# Altium footprint library Sockets.PcbLib: 80 footprints (part 4 of 6)
Each footprint in its own frame and in the unit in brackets; x right, y up, seen from the top. Pads: shape width x height; smd on the part's side, far side on the other; paste and mask are expansions set on the pad; w line width, h text height; cw(c..) or ccw(c..) is an arc to the next point about the centre after c.
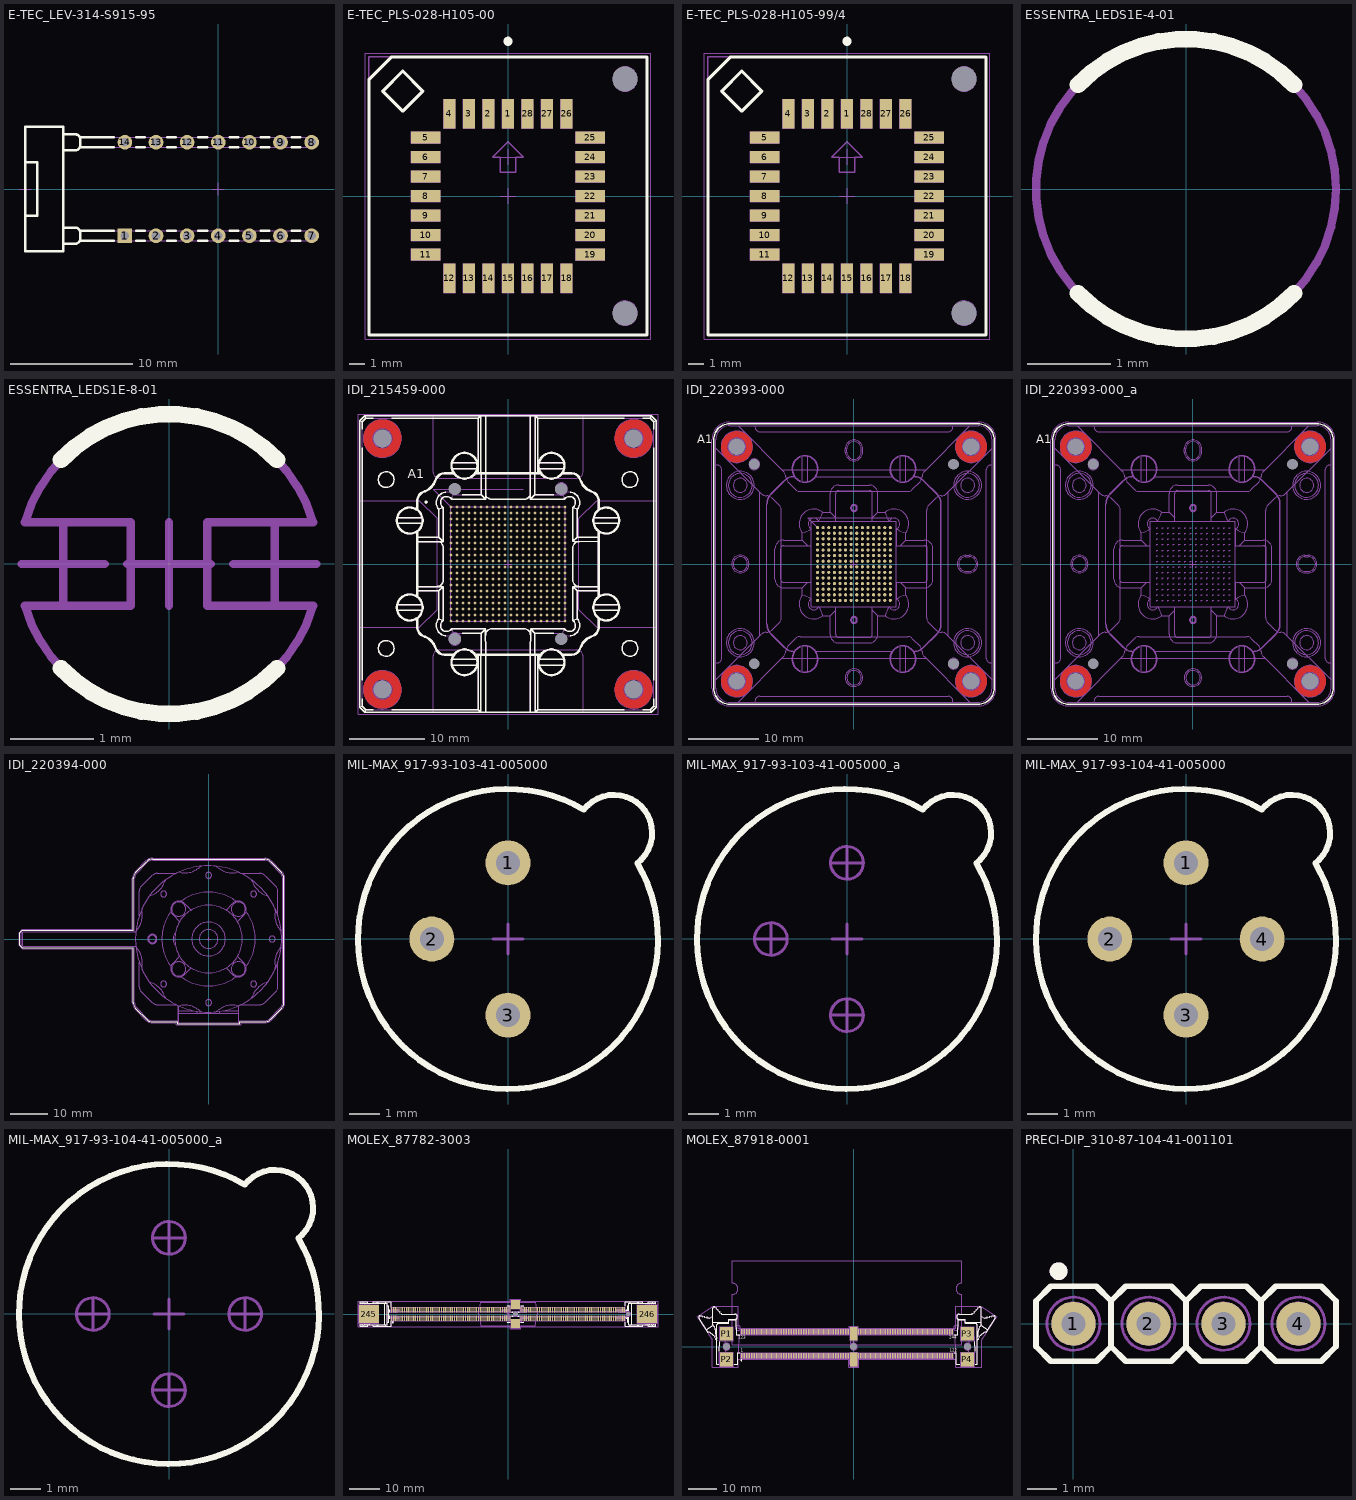
[diagram p3: the footprints below, top view; thin cyan lines are the x and y axes]

## E-TEC_LEV-314-S915-95 [mm] "Vertical DIP Socket 14 Leads, Row Spacing 7.62mm; Pitch 2.54 mm"
height 20.32
pads (14):
  rect 1.2x1.2 hole 0.7: 1(-7.62,-3.81)
  round 1.2 hole 0.7: 2(-5.08,-3.81) 3(-2.54,-3.81) 4(0,-3.81) 5(2.54,-3.81) 6(5.08,-3.81) 7(7.62,-3.81) 8(7.62,3.81) 9(5.08,3.81) 10(2.54,3.81) 11(0,3.81) 12(-2.54,3.81) 13(-5.08,3.81) 14(-7.62,3.81)
Top Overlay:
  lines w0.2: -15.76,-2.2 -14.76,-2.2 -14.76,2.2 -15.76,2.2 ; -12.66,-4.46 -11.66,-4.46 ccw(c-11.66,-4.06) -11.26,-4.06 -11.26,-3.56 ccw(c-11.66,-3.56) -11.66,-3.16 -12.66,-3.16 ; -12.66,3.16 -11.66,3.16 ccw(c-11.66,3.56) -11.26,3.56 -11.26,4.06 ccw(c-11.66,4.06) -11.66,4.46 -12.66,4.46 ; -11.289,-4.21 -8.536,-4.21 ; -11.289,-3.41 -8.536,-3.41 ; -11.289,3.41 -8.536,3.41 ; -11.289,4.21 -8.536,4.21 ; -6.703,-4.21 -5.996,-4.21 ; -6.703,-3.41 -5.996,-3.41 ; -6.703,3.41 -5.996,3.41 ; -6.703,4.21 -5.996,4.21 ; -4.163,-4.21 -3.456,-4.21 ; -4.163,-3.41 -3.456,-3.41 ; -4.163,3.41 -3.456,3.41 ; -4.163,4.21 -3.456,4.21 ; -1.623,-4.21 -0.916,-4.21 ; -1.623,-3.41 -0.916,-3.41 ; -1.623,3.41 -0.916,3.41 ; -1.623,4.21 -0.916,4.21 ; 0.917,-4.21 1.624,-4.21 ; 0.917,-3.41 1.624,-3.41 ; 0.917,3.41 1.624,3.41 ; 0.917,4.21 1.624,4.21 ; 3.457,-4.21 4.164,-4.21 ; 3.457,-3.41 4.164,-3.41 ; 3.457,3.41 4.164,3.41 ; 3.457,4.21 4.164,4.21 ; 5.997,-4.21 6.704,-4.21 ; 5.997,-3.41 6.704,-3.41 ; 5.997,3.41 6.704,3.41 ; 5.997,4.21 6.704,4.21 ; -15.76,-5.08 -12.66,-5.08 -12.66,5.08 -15.76,5.08 -15.76,-5.08
Mechanical 8:
  lines w0.1: -16.26,0 -15.76,0 ; -15.76,-0.5 -15.76,0 ; -15.76,0.5 -15.76,0 ; -15.26,0 -15.76,0 ; -8.12,-3.81 -7.62,-3.81 ; -8.12,3.81 -7.62,3.81 ; -7.62,-4.31 -7.62,-3.81 ; -7.62,-3.31 -7.62,-3.81 ; -7.62,3.31 -7.62,3.81 ; -7.62,4.31 -7.62,3.81 ; -7.12,-3.81 -7.62,-3.81 ; -7.12,3.81 -7.62,3.81 ; -5.58,-3.81 -5.08,-3.81 ; -5.58,3.81 -5.08,3.81 ; -5.08,-4.31 -5.08,-3.81 ; -5.08,-3.31 -5.08,-3.81 ; -5.08,3.31 -5.08,3.81 ; -5.08,4.31 -5.08,3.81 ; -4.58,-3.81 -5.08,-3.81 ; -4.58,3.81 -5.08,3.81 ; -3.04,-3.81 -2.54,-3.81 ; -3.04,3.81 -2.54,3.81 ; -2.54,-4.31 -2.54,-3.81 ; -2.54,-3.31 -2.54,-3.81 ; -2.54,3.31 -2.54,3.81 ; -2.54,4.31 -2.54,3.81 ; -2.04,-3.81 -2.54,-3.81 ; -2.04,3.81 -2.54,3.81 ; -0.5,-3.81 0,-3.81 ; -0.5,0 0,0 ; -0.5,3.81 0,3.81 ; 0,-4.31 0,-3.81 ; 0,-3.31 0,-3.81 ; 0,-0.5 0,0 ; 0,0.5 0,0 ; 0,3.31 0,3.81 ; 0,4.31 0,3.81 ; 0.5,-3.81 0,-3.81 ; 0.5,0 0,0 ; 0.5,3.81 0,3.81 ; 2.04,-3.81 2.54,-3.81 ; 2.04,3.81 2.54,3.81 ; 2.54,-4.31 2.54,-3.81 ; 2.54,-3.31 2.54,-3.81 ; 2.54,3.31 2.54,3.81 ; 2.54,4.31 2.54,3.81 ; 3.04,-3.81 2.54,-3.81 ; 3.04,3.81 2.54,3.81 ; 4.58,-3.81 5.08,-3.81 ; 4.58,3.81 5.08,3.81 ; 5.08,-4.31 5.08,-3.81 ; 5.08,-3.31 5.08,-3.81 ; 5.08,3.31 5.08,3.81 ; 5.08,4.31 5.08,3.81 ; 5.58,-3.81 5.08,-3.81 ; 5.58,3.81 5.08,3.81 ; 7.12,-3.81 7.62,-3.81 ; 7.12,3.81 7.62,3.81 ; 7.62,-4.31 7.62,-3.81 ; 7.62,-3.31 7.62,-3.81 ; 7.62,3.31 7.62,3.81 ; 7.62,4.31 7.62,3.81 ; 8.12,-3.81 7.62,-3.81 ; 8.12,3.81 7.62,3.81
Mechanical 14:
  lines w0.1: -15.76,-2.2 -14.76,-2.2 -14.76,2.2 -15.76,2.2 ; -12.66,-4.46 -11.66,-4.46 ccw(c-11.66,-4.06) -11.26,-4.06 -11.26,-3.56 ccw(c-11.66,-3.56) -11.66,-3.16 -12.66,-3.16 ; -12.66,3.16 -11.66,3.16 ccw(c-11.66,3.56) -11.26,3.56 -11.26,4.06 ccw(c-11.66,4.06) -11.66,4.46 -12.66,4.46 ; -11.289,-4.21 7.62,-4.21 ccw(c7.62,-3.81) 7.62,-3.41 -11.289,-3.41 ; -11.289,3.41 7.62,3.41 ccw(c7.62,3.81) 7.62,4.21 -11.289,4.21 ; -15.76,-5.08 -12.66,-5.08 -12.66,5.08 -15.76,5.08 -15.76,-5.08
3D body "E-TEC_LEV-314-S915-95.stp": height 20.32, standoff -2.8, extent -15.76,-5.08 8.02,5.08

## E-TEC_PLS-028-H105-00 [mm] "28 Leads SMD PLCC Socket, Pitch 1.27 mm, Body 18.12x18.12mm"
height 4.6
pads (30):
  rect 0.76x1.9 smd: 1(0,5.355) 2(-1.27,5.355) 3(-2.54,5.355) 4(-3.81,5.355) 12(-3.81,-5.355) 13(-2.54,-5.355) 14(-1.27,-5.355) 15(0,-5.355) 16(1.27,-5.355) 17(2.54,-5.355) 18(3.81,-5.355) 26(3.81,5.355) 27(2.54,5.355) 28(1.27,5.355)
  rect 1.9x0.76 smd: 5(-5.355,3.81) 6(-5.355,2.54) 7(-5.355,1.27) 8(-5.355,0) 9(-5.355,-1.27) 10(-5.355,-2.54) 11(-5.355,-3.81) 19(5.355,-3.81) 20(5.355,-2.54) 21(5.355,-1.27) 22(5.355,0) 23(5.355,1.27) 24(5.355,2.54) 25(5.355,3.81)
  round 0.5 hole 1.6 unplated: MEC1(7.62,7.62) MEC2(7.62,-7.62)
Top Overlay:
  circle w0.3: c0,10.075 r0.15
  lines w0.2: -9.06,-9.06 -9.06,7.575 -7.575,9.06 9.06,9.06 9.06,-9.06 -9.06,-9.06 ; -8.162,6.833 -6.854,8.141 -5.546,6.833 -6.854,5.525 -8.162,6.833
Mechanical 8:
  drawing of 186 lines, arcs and shapes, not listed
Mechanical 14:
  lines w0.1: -9.06,7.575 -7.61,9.025 ; -9.06,-9.06 -9.06,9.06 9.06,9.06 9.06,-9.06 -9.06,-9.06 ; -8.162,6.833 -6.854,8.141 -5.546,6.833 -6.854,5.525 -8.162,6.833 ; -1,2.54 0,3.54 1,2.54 0.5,2.54 0.5,1.54 -0.5,1.54 -0.5,2.54 -1,2.54
Mechanical 15:
  lines w0.05: -9.31,-9.31 -9.31,9.31 9.31,9.31 9.31,-9.31 -9.31,-9.31
3D body "E-TEC_PLS-028-H105-00.stp": height 4.6, standoff -1.05, extent -9.07,-9.07 9.07,9.07

## E-TEC_PLS-028-H105-99/4 [mm] "28 Leads SMD PLCC Socket, Pitch 1.27 mm, Body 18.12x18.12mm"
height 4.6
pads (30):
  rect 0.76x1.9 smd: 1(0,5.355) 2(-1.27,5.355) 3(-2.54,5.355) 4(-3.81,5.355) 12(-3.81,-5.355) 13(-2.54,-5.355) 14(-1.27,-5.355) 15(0,-5.355) 16(1.27,-5.355) 17(2.54,-5.355) 18(3.81,-5.355) 26(3.81,5.355) 27(2.54,5.355) 28(1.27,5.355)
  rect 1.9x0.76 smd: 5(-5.355,3.81) 6(-5.355,2.54) 7(-5.355,1.27) 8(-5.355,0) 9(-5.355,-1.27) 10(-5.355,-2.54) 11(-5.355,-3.81) 19(5.355,-3.81) 20(5.355,-2.54) 21(5.355,-1.27) 22(5.355,0) 23(5.355,1.27) 24(5.355,2.54) 25(5.355,3.81)
  round 0.5 hole 1.6 unplated: MEC1(7.62,7.62) MEC2(7.62,-7.62)
Top Overlay:
  circle w0.3: c0,10.075 r0.15
  lines w0.2: -9.06,-9.06 -9.06,7.575 -7.575,9.06 9.06,9.06 9.06,-9.06 -9.06,-9.06 ; -8.162,6.833 -6.854,8.141 -5.546,6.833 -6.854,5.525 -8.162,6.833
Mechanical 8:
  drawing of 186 lines, arcs and shapes, not listed
Mechanical 14:
  lines w0.1: -9.06,7.575 -7.61,9.025 ; -9.06,-9.06 -9.06,9.06 9.06,9.06 9.06,-9.06 -9.06,-9.06 ; -8.162,6.833 -6.854,8.141 -5.546,6.833 -6.854,5.525 -8.162,6.833 ; -1,2.54 0,3.54 1,2.54 0.5,2.54 0.5,1.54 -0.5,1.54 -0.5,2.54 -1,2.54
Mechanical 15:
  lines w0.05: -9.31,-9.31 -9.31,9.31 9.31,9.31 9.31,-9.31 -9.31,-9.31
3D body "E-TEC_PLS-028-H105-99-4.stp": height 4.6, standoff -1.05, extent -9.07,-9.07 9.07,9.07

## ESSENTRA_LEDS1E-4-01 [mm] "6.4mm Vertical Spacer For 3mm LED - LEDS1E Serie"
height 6.4
Top Overlay:
  lines w0.2: -1.296,-1.25 ccw(c0,0) 1.296,-1.25 ; -1.295,1.25 cw(c0,0) 1.295,1.25
Mechanical 14:
  circle w0.1: c0,0 r1.8
3D body "ESSENTRA_LEDS1E-4-01.stp": height 6.4, standoff 0, extent -1.729,-1.8 1.729,1.8

## ESSENTRA_LEDS1E-8-01 [mm] "12.7mm Vertical Spacer For 3mm LED  - LEDS1E Series"
height 12.7
Top Overlay:
  lines w0.2: -1.296,-1.25 ccw(c0,0) 1.296,-1.25 ; -1.295,1.25 cw(c0,0) 1.295,1.25
Mechanical 8:
  lines w0.1: -1.77,0 -1.27,0 ; -1.27,-0.5 -1.27,0 ; -1.27,0.5 -1.27,0 ; -0.77,0 -1.27,0 ; -0.5,0 0,0 ; 0,-0.5 0,0 ; 0,0.5 0,0 ; 0.5,0 0,0 ; 0.77,0 1.27,0 ; 1.27,-0.5 1.27,0 ; 1.27,0.5 1.27,0 ; 1.77,0 1.27,0
Mechanical 14:
  lines w0.1: -1.729,-0.5 ccw(c0,0) 1.729,-0.5 0.46,-0.5 0.46,0.5 1.729,0.5 ccw(c0,0) -1.729,0.5 -0.46,0.5 -0.46,-0.5 -1.729,-0.5
3D body "ESSENTRA_LEDS1E-8-01.stp": height 12.7, standoff 0, extent -1.729,-1.8 1.729,1.8

## IDI_215459-000 [mm] "400 Pins, Pitch 0.8mm, Matrix 20x20, BGA Test Socket"
height 6.49
pads (408):
  round 0.5 hole 1.65 unplated: 1(-7.1,-10) 2(7.1,-10) 3(7.1,10) 4(-7.1,10)
  round 0.5 hole 2.4 unplated: 5(-16.75,-16.75) 6(16.75,-16.75) 7(16.75,16.75) 8(-16.75,16.75)
  round 0.36 smd paste-0.181: A1(-7.6,7.6) A2(-6.8,7.6) A3(-6,7.6) A4(-5.2,7.6) A5(-4.4,7.6) A6(-3.6,7.6) A7(-2.8,7.6) A8(-2,7.6) A9(-1.2,7.6) A10(-0.4,7.6) A11(0.4,7.6) A12(1.2,7.6) A13(2,7.6) A14(2.8,7.6) A15(3.6,7.6) A16(4.4,7.6) A17(5.2,7.6) A18(6,7.6) A19(6.8,7.6) A20(7.6,7.6) B1(-7.6,6.8) B2(-6.8,6.8) B3(-6,6.8) B4(-5.2,6.8) B5(-4.4,6.8) B6(-3.6,6.8) B7(-2.8,6.8) B8(-2,6.8) B9(-1.2,6.8) B10(-0.4,6.8) B11(0.4,6.8) B12(1.2,6.8) B13(2,6.8) B14(2.8,6.8) B15(3.6,6.8) B16(4.4,6.8) B17(5.2,6.8) B18(6,6.8) B19(6.8,6.8) B20(7.6,6.8) C1(-7.6,6) C2(-6.8,6) C3(-6,6) C4(-5.2,6) C5(-4.4,6) C6(-3.6,6) C7(-2.8,6) C8(-2,6) C9(-1.2,6) C10(-0.4,6) C11(0.4,6) C12(1.2,6) C13(2,6) C14(2.8,6) C15(3.6,6) C16(4.4,6) C17(5.2,6) C18(6,6) C19(6.8,6) C20(7.6,6) D1(-7.6,5.2) D2(-6.8,5.2) D3(-6,5.2) D4(-5.2,5.2) D5(-4.4,5.2) D6(-3.6,5.2) D7(-2.8,5.2) D8(-2,5.2) D9(-1.2,5.2) D10(-0.4,5.2) D11(0.4,5.2) D12(1.2,5.2) D13(2,5.2) D14(2.8,5.2) D15(3.6,5.2) D16(4.4,5.2) D17(5.2,5.2) D18(6,5.2) D19(6.8,5.2) D20(7.6,5.2) E1(-7.6,4.4) E2(-6.8,4.4) E3(-6,4.4) E4(-5.2,4.4) E5(-4.4,4.4) E6(-3.6,4.4) E7(-2.8,4.4) E8(-2,4.4) E9(-1.2,4.4) E10(-0.4,4.4) E11(0.4,4.4) E12(1.2,4.4) E13(2,4.4) E14(2.8,4.4) E15(3.6,4.4) E16(4.4,4.4) E17(5.2,4.4) E18(6,4.4) E19(6.8,4.4) E20(7.6,4.4) F1(-7.6,3.6) F2(-6.8,3.6) F3(-6,3.6) F4(-5.2,3.6) F5(-4.4,3.6) F6(-3.6,3.6) F7(-2.8,3.6) F8(-2,3.6) F9(-1.2,3.6) F10(-0.4,3.6) F11(0.4,3.6) F12(1.2,3.6) F13(2,3.6) F14(2.8,3.6) F15(3.6,3.6) F16(4.4,3.6) F17(5.2,3.6) F18(6,3.6) F19(6.8,3.6) F20(7.6,3.6) G1(-7.6,2.8) G2(-6.8,2.8) G3(-6,2.8) G4(-5.2,2.8) G5(-4.4,2.8) G6(-3.6,2.8) G7(-2.8,2.8) G8(-2,2.8) G9(-1.2,2.8) G10(-0.4,2.8) G11(0.4,2.8) G12(1.2,2.8) G13(2,2.8) G14(2.8,2.8) G15(3.6,2.8) G16(4.4,2.8) G17(5.2,2.8) G18(6,2.8) G19(6.8,2.8) G20(7.6,2.8) H1(-7.6,2) H2(-6.8,2) H3(-6,2) H4(-5.2,2) H5(-4.4,2) H6(-3.6,2) H7(-2.8,2) H8(-2,2) H9(-1.2,2) H10(-0.4,2) H11(0.4,2) H12(1.2,2) H13(2,2) H14(2.8,2) H15(3.6,2) H16(4.4,2) H17(5.2,2) H18(6,2) H19(6.8,2) H20(7.6,2) J1(-7.6,1.2) J2(-6.8,1.2) J3(-6,1.2) J4(-5.2,1.2) J5(-4.4,1.2) J6(-3.6,1.2) J7(-2.8,1.2) J8(-2,1.2) J9(-1.2,1.2) J10(-0.4,1.2) J11(0.4,1.2) J12(1.2,1.2) J13(2,1.2) J14(2.8,1.2) J15(3.6,1.2) J16(4.4,1.2) J17(5.2,1.2) J18(6,1.2) J19(6.8,1.2) J20(7.6,1.2) K1(-7.6,0.4) K2(-6.8,0.4) K3(-6,0.4) K4(-5.2,0.4) K5(-4.4,0.4) K6(-3.6,0.4) K7(-2.8,0.4) K8(-2,0.4) K9(-1.2,0.4) K10(-0.4,0.4) K11(0.4,0.4) K12(1.2,0.4) K13(2,0.4) K14(2.8,0.4) K15(3.6,0.4) K16(4.4,0.4) K17(5.2,0.4) K18(6,0.4) K19(6.8,0.4) K20(7.6,0.4) L1(-7.6,-0.4) L2(-6.8,-0.4) L3(-6,-0.4) L4(-5.2,-0.4) L5(-4.4,-0.4) L6(-3.6,-0.4) L7(-2.8,-0.4) L8(-2,-0.4) L9(-1.2,-0.4) L10(-0.4,-0.4) L11(0.4,-0.4) L12(1.2,-0.4) L13(2,-0.4) L14(2.8,-0.4) L15(3.6,-0.4) L16(4.4,-0.4) L17(5.2,-0.4) L18(6,-0.4) L19(6.8,-0.4) L20(7.6,-0.4) M1(-7.6,-1.2) M2(-6.8,-1.2) M3(-6,-1.2) M4(-5.2,-1.2) M5(-4.4,-1.2) M6(-3.6,-1.2) M7(-2.8,-1.2) M8(-2,-1.2) M9(-1.2,-1.2) M10(-0.4,-1.2) M11(0.4,-1.2) M12(1.2,-1.2) M13(2,-1.2) M14(2.8,-1.2) M15(3.6,-1.2) M16(4.4,-1.2) M17(5.2,-1.2) M18(6,-1.2) M19(6.8,-1.2) M20(7.6,-1.2) N1(-7.6,-2) N2(-6.8,-2) N3(-6,-2) N4(-5.2,-2) N5(-4.4,-2) N6(-3.6,-2) N7(-2.8,-2) N8(-2,-2) N9(-1.2,-2) N10(-0.4,-2) N11(0.4,-2) N12(1.2,-2) N13(2,-2) N14(2.8,-2) N15(3.6,-2) N16(4.4,-2) N17(5.2,-2) N18(6,-2) N19(6.8,-2) N20(7.6,-2) P1(-7.6,-2.8) P2(-6.8,-2.8) P3(-6,-2.8) P4(-5.2,-2.8) P5(-4.4,-2.8) P6(-3.6,-2.8) P7(-2.8,-2.8) P8(-2,-2.8) P9(-1.2,-2.8) P10(-0.4,-2.8) P11(0.4,-2.8) P12(1.2,-2.8) P13(2,-2.8) P14(2.8,-2.8) P15(3.6,-2.8) P16(4.4,-2.8) P17(5.2,-2.8) P18(6,-2.8) P19(6.8,-2.8) P20(7.6,-2.8) R1(-7.6,-3.6) R2(-6.8,-3.6) R3(-6,-3.6) R4(-5.2,-3.6) R5(-4.4,-3.6) R6(-3.6,-3.6) R7(-2.8,-3.6) R8(-2,-3.6) R9(-1.2,-3.6) R10(-0.4,-3.6) R11(0.4,-3.6) R12(1.2,-3.6) R13(2,-3.6) R14(2.8,-3.6) R15(3.6,-3.6) R16(4.4,-3.6) R17(5.2,-3.6) R18(6,-3.6) R19(6.8,-3.6) R20(7.6,-3.6) T1(-7.6,-4.4) T2(-6.8,-4.4) T3(-6,-4.4) T4(-5.2,-4.4) T5(-4.4,-4.4) T6(-3.6,-4.4) T7(-2.8,-4.4) T8(-2,-4.4) T9(-1.2,-4.4) T10(-0.4,-4.4) T11(0.4,-4.4) T12(1.2,-4.4) T13(2,-4.4) T14(2.8,-4.4) T15(3.6,-4.4) T16(4.4,-4.4) T17(5.2,-4.4) T18(6,-4.4) T19(6.8,-4.4) T20(7.6,-4.4) U1(-7.6,-5.2) U2(-6.8,-5.2) U3(-6,-5.2) U4(-5.2,-5.2) U5(-4.4,-5.2) U6(-3.6,-5.2) U7(-2.8,-5.2) U8(-2,-5.2) U9(-1.2,-5.2) U10(-0.4,-5.2) U11(0.4,-5.2) U12(1.2,-5.2) U13(2,-5.2) U14(2.8,-5.2) U15(3.6,-5.2) U16(4.4,-5.2) U17(5.2,-5.2) U18(6,-5.2) U19(6.8,-5.2) U20(7.6,-5.2) V1(-7.6,-6) V2(-6.8,-6) V3(-6,-6) V4(-5.2,-6) V5(-4.4,-6) V6(-3.6,-6) V7(-2.8,-6) V8(-2,-6) V9(-1.2,-6) V10(-0.4,-6) V11(0.4,-6) V12(1.2,-6) V13(2,-6) V14(2.8,-6) V15(3.6,-6) V16(4.4,-6) V17(5.2,-6) V18(6,-6) V19(6.8,-6) V20(7.6,-6) W1(-7.6,-6.8) W2(-6.8,-6.8) W3(-6,-6.8) W4(-5.2,-6.8) W5(-4.4,-6.8) W6(-3.6,-6.8) W7(-2.8,-6.8) W8(-2,-6.8) W9(-1.2,-6.8) W10(-0.4,-6.8) W11(0.4,-6.8) W12(1.2,-6.8) W13(2,-6.8) W14(2.8,-6.8) W15(3.6,-6.8) W16(4.4,-6.8) W17(5.2,-6.8) W18(6,-6.8) W19(6.8,-6.8) W20(7.6,-6.8) Y1(-7.6,-7.6) Y2(-6.8,-7.6) Y3(-6,-7.6) Y4(-5.2,-7.6) Y5(-4.4,-7.6) Y6(-3.6,-7.6) Y7(-2.8,-7.6) Y8(-2,-7.6) Y9(-1.2,-7.6) Y10(-0.4,-7.6) Y11(0.4,-7.6) Y12(1.2,-7.6) Y13(2,-7.6) Y14(2.8,-7.6) Y15(3.6,-7.6) Y16(4.4,-7.6) Y17(5.2,-7.6) Y18(6,-7.6) Y19(6.8,-7.6) Y20(7.6,-7.6)
Top Layer:
  circle w1.205: c16.75,-16.75 r1.937
  circle w1.205: c-16.75,-16.75 r1.937
  circle w1.205: c16.75,16.75 r1.937
  circle w1.205: c-16.75,16.75 r1.937
Bottom Layer:
  circle w1.205: c16.75,-16.75 r1.937
  circle w1.205: c-16.75,-16.75 r1.937
  circle w1.205: c16.75,16.75 r1.937
  circle w1.205: c-16.75,16.75 r1.937
Top Overlay:
  drawing of 215 lines, arcs and shapes, not listed
  text "A1" at -13.335,11.43 h1.2
Mechanical 8:
  circle w0.1: c7.1,10 r0.825
  circle w0.1: c-7.1,-10 r0.825
  circle w0.1: c-16.75,16.75 r1.2
  circle w0.1: c-16.75,16.75 r1.335
  circle w0.1: c-16.75,16.75 r2.54
  circle w0.1: c16.75,16.75 r1.2
  circle w0.1: c16.75,16.75 r1.335
  circle w0.1: c16.75,16.75 r2.54
  circle w0.1: c16.75,-16.75 r1.2
  circle w0.1: c16.75,-16.75 r1.335
  circle w0.1: c16.75,-16.75 r2.54
  circle w0.1: c-16.75,-16.75 r1.2
  circle w0.1: c-16.75,-16.75 r1.335
  circle w0.1: c-16.75,-16.75 r2.54
  lines w0.1: -17.25,-16.75 -16.75,-16.75 ; -17.25,16.75 -16.75,16.75 ; -16.75,-17.25 -16.75,-16.75 ; -16.75,-16.25 -16.75,-16.75 ; -16.75,16.25 -16.75,16.75 ; -16.75,17.25 -16.75,16.75 ; -16.25,-16.75 -16.75,-16.75 ; -16.25,16.75 -16.75,16.75 ; -7.6,-10 -7.1,-10 ; -7.6,10 -7.1,10 ; -7.1,-10.5 -7.1,-10 ; -7.1,-9.5 -7.1,-10 ; -7.1,9.5 -7.1,10 ; -7.1,10.5 -7.1,10 ; -6.6,-10 -7.1,-10 ; -6.6,10 -7.1,10 ; 2.01,9.99 -9.99,9.99 -7.6,7.6 ; 6.6,-10 7.1,-10 ; 6.6,10 7.1,10 ; 7.1,-10.5 7.1,-10 ; 7.1,-9.5 7.1,-10 ; 7.1,9.5 7.1,10 ; 7.1,10.5 7.1,10 ; 7.6,-10 7.1,-10 ; 7.6,10 7.1,10 ; 16.25,-16.75 16.75,-16.75 ; 16.25,16.75 16.75,16.75 ; 16.75,-17.25 16.75,-16.75 ; 16.75,-16.25 16.75,-16.75 ; 16.75,16.25 16.75,16.75 ; 16.75,17.25 16.75,16.75 ; 17.25,-16.75 16.75,-16.75 ; 17.25,16.75 16.75,16.75 ; -7.6,7.6 -7.6,-7.6 7.6,-7.6 7.6,7.6 -7.6,7.6 ; 0,0 -0.5,0 0,0 ; 0,0 0,0.5 0,0 ; 0,0 0.5,0 0,0 ; 0,0 0,-0.5 0,0 ; -19.75,-8.46 -11.802,-8.46 -9.46,-6.118 -9.46,6.118 -11.802,8.46 -19.75,8.46 -19.75,-8.46 ; -10,-19.75 -10,-12.26 cw(c-9.2,-12.26) -9.2,-11.46 9.2,-11.46 cw(c9.2,-12.26) 10,-12.26 10,-19.75 -10,-19.75 ; -10,12.26 ccw(c-9.2,12.26) -9.2,11.46 9.2,11.46 ccw(c9.2,12.26) 10,12.26 10,19.75 -10,19.75 -10,12.26 ; 9.46,-6.118 9.46,6.118 11.802,8.46 19.75,8.46 19.75,-8.46 11.802,-8.46 9.46,-6.118
  text "Spring Contacts" at -9.14,10.4 h1
  text "COMPONENT" at -16.51,5.08 h1.2
  text "CLEARANCE" at -18.415,5.08 h1.2
  text "CLEARANCE" at -5.08,-18.415 h1.2
  text "COMPONENT" at -5.08,-16.51 h1.2
  text "CLEARANCE" at 18.415,-4.445 h1.2
  text "COMPONENT" at 16.51,-4.445 h1.2
  text "CLEARANCE" at 4.445,18.415 h1.2
  text "COMPONENT" at 4.445,16.51 h1.2
Mechanical 14:
  drawing of 215 lines, arcs and shapes, not listed
  text "A1" at -13.335,11.43 h1.2
  text "Y" at -9.4,-7.9 h0.6
  text "W" at -9.4,-7.1 h0.6
  text "V" at -9.4,-6.3 h0.6
  text "U" at -9.4,-5.5 h0.6
  text "T" at -9.4,-4.7 h0.6
  text "R" at -9.4,-3.9 h0.6
  text "P" at -9.4,-3.1 h0.6
  text "N" at -9.4,-2.3 h0.6
  text "M" at -9.4,-1.5 h0.6
  text "L" at -9.4,-0.7 h0.6
  text "K" at -9.4,0.1 h0.6
  text "J" at -9.4,0.9 h0.6
  text "H" at -9.4,1.7 h0.6
  text "G" at -9.4,2.5 h0.6
  text "F" at -9.4,3.3 h0.6
  text "E" at -9.4,4.1 h0.6
  text "D" at -9.4,4.9 h0.6
  text "C" at -9.4,5.7 h0.6
  text "B" at -9.4,6.5 h0.6
  text "A" at -9.4,7.3 h0.6
  text "1" at -7.35,8.9 h0.6
  text "2" at -6.55,8.9 h0.6
  text "3" at -5.75,8.9 h0.6
  text "4" at -4.95,8.9 h0.6
  text "5" at -4.15,8.9 h0.6
  text "6" at -3.35,8.9 h0.6
  text "7" at -2.55,8.9 h0.6
  text "8" at -1.75,8.9 h0.6
  text "9" at -0.95,8.9 h0.6
  text "10" at -0.15,8.9 h0.6
  text "11" at 0.65,8.9 h0.6
  text "12" at 1.45,8.9 h0.6
  text "13" at 2.25,8.9 h0.6
  text "14" at 3.05,8.9 h0.6
  text "15" at 3.85,8.9 h0.6
  text "16" at 4.65,8.9 h0.6
  text "17" at 5.45,8.9 h0.6
  text "18" at 6.25,8.9 h0.6
  text "19" at 7.05,8.9 h0.6
  text "20" at 7.85,8.9 h0.6
Mechanical 15:
  lines w0.05: -0.5,0 0,0 ; 0,-0.5 0,0 ; 0,0.5 0,0 ; 0.5,0 0,0 ; -20,-20 20,-20 20,20 -20,20 -20,-20
3D body "IDI_215459-000.stp": height 6.49, standoff -5.44, extent -19.75,-19.75 19.75,19.75

## IDI_220393-000 [mm] "196 Pins, Pitch 0.8mm, Matrix 14x14, BGA Test Socket (Contactor Part)"
height 6.41
pads (204):
  round 0.5 hole 1.55 unplated: 1(-14.25,14.25) 2(-14.25,-14.25) 3(14.25,-14.25) 4(14.25,14.25)
  round 0.5 hole 2.4 unplated: 5(-16.75,16.75) 6(-16.75,-16.75) 7(16.75,-16.75) 8(16.75,16.75)
  round 0.45 smd paste-0.226: A1(-5.2,5.2) A2(-4.4,5.2) A3(-3.6,5.2) A4(-2.8,5.2) A5(-2,5.2) A6(-1.2,5.2) A7(-0.4,5.2) A8(0.4,5.2) A9(1.2,5.2) A10(2,5.2) A11(2.8,5.2) A12(3.6,5.2) A13(4.4,5.2) A14(5.2,5.2) B1(-5.2,4.4) B2(-4.4,4.4) B3(-3.6,4.4) B4(-2.8,4.4) B5(-2,4.4) B6(-1.2,4.4) B7(-0.4,4.4) B8(0.4,4.4) B9(1.2,4.4) B10(2,4.4) B11(2.8,4.4) B12(3.6,4.4) B13(4.4,4.4) B14(5.2,4.4) C1(-5.2,3.6) C2(-4.4,3.6) C3(-3.6,3.6) C4(-2.8,3.6) C5(-2,3.6) C6(-1.2,3.6) C7(-0.4,3.6) C8(0.4,3.6) C9(1.2,3.6) C10(2,3.6) C11(2.8,3.6) C12(3.6,3.6) C13(4.4,3.6) C14(5.2,3.6) D1(-5.2,2.8) D2(-4.4,2.8) D3(-3.6,2.8) D4(-2.8,2.8) D5(-2,2.8) D6(-1.2,2.8) D7(-0.4,2.8) D8(0.4,2.8) D9(1.2,2.8) D10(2,2.8) D11(2.8,2.8) D12(3.6,2.8) D13(4.4,2.8) D14(5.2,2.8) E1(-5.2,2) E2(-4.4,2) E3(-3.6,2) E4(-2.8,2) E5(-2,2) E6(-1.2,2) E7(-0.4,2) E8(0.4,2) E9(1.2,2) E10(2,2) E11(2.8,2) E12(3.6,2) E13(4.4,2) E14(5.2,2) F1(-5.2,1.2) F2(-4.4,1.2) F3(-3.6,1.2) F4(-2.8,1.2) F5(-2,1.2) F6(-1.2,1.2) F7(-0.4,1.2) F8(0.4,1.2) F9(1.2,1.2) F10(2,1.2) F11(2.8,1.2) F12(3.6,1.2) F13(4.4,1.2) F14(5.2,1.2) G1(-5.2,0.4) G2(-4.4,0.4) G3(-3.6,0.4) G4(-2.8,0.4) G5(-2,0.4) G6(-1.2,0.4) G7(-0.4,0.4) G8(0.4,0.4) G9(1.2,0.4) G10(2,0.4) G11(2.8,0.4) G12(3.6,0.4) G13(4.4,0.4) G14(5.2,0.4) H1(-5.2,-0.4) H2(-4.4,-0.4) H3(-3.6,-0.4) H4(-2.8,-0.4) H5(-2,-0.4) H6(-1.2,-0.4) H7(-0.4,-0.4) H8(0.4,-0.4) H9(1.2,-0.4) H10(2,-0.4) H11(2.8,-0.4) H12(3.6,-0.4) H13(4.4,-0.4) H14(5.2,-0.4) J1(-5.2,-1.2) J2(-4.4,-1.2) J3(-3.6,-1.2) J4(-2.8,-1.2) J5(-2,-1.2) J6(-1.2,-1.2) J7(-0.4,-1.2) J8(0.4,-1.2) J9(1.2,-1.2) J10(2,-1.2) J11(2.8,-1.2) J12(3.6,-1.2) J13(4.4,-1.2) J14(5.2,-1.2) K1(-5.2,-2) K2(-4.4,-2) K3(-3.6,-2) K4(-2.8,-2) K5(-2,-2) K6(-1.2,-2) K7(-0.4,-2) K8(0.4,-2) K9(1.2,-2) K10(2,-2) K11(2.8,-2) K12(3.6,-2) K13(4.4,-2) K14(5.2,-2) L1(-5.2,-2.8) L2(-4.4,-2.8) L3(-3.6,-2.8) L4(-2.8,-2.8) L5(-2,-2.8) L6(-1.2,-2.8) L7(-0.4,-2.8) L8(0.4,-2.8) L9(1.2,-2.8) L10(2,-2.8) L11(2.8,-2.8) L12(3.6,-2.8) L13(4.4,-2.8) L14(5.2,-2.8) M1(-5.2,-3.6) M2(-4.4,-3.6) M3(-3.6,-3.6) M4(-2.8,-3.6) M5(-2,-3.6) M6(-1.2,-3.6) M7(-0.4,-3.6) M8(0.4,-3.6) M9(1.2,-3.6) M10(2,-3.6) M11(2.8,-3.6) M12(3.6,-3.6) M13(4.4,-3.6) M14(5.2,-3.6) N1(-5.2,-4.4) N2(-4.4,-4.4) N3(-3.6,-4.4) N4(-2.8,-4.4) N5(-2,-4.4) N6(-1.2,-4.4) N7(-0.4,-4.4) N8(0.4,-4.4) N9(1.2,-4.4) N10(2,-4.4) N11(2.8,-4.4) N12(3.6,-4.4) N13(4.4,-4.4) N14(5.2,-4.4) P1(-5.2,-5.2) P2(-4.4,-5.2) P3(-3.6,-5.2) P4(-2.8,-5.2) P5(-2,-5.2) P6(-1.2,-5.2) P7(-0.4,-5.2) P8(0.4,-5.2) P9(1.2,-5.2) P10(2,-5.2) P11(2.8,-5.2) P12(3.6,-5.2) P13(4.4,-5.2) P14(5.2,-5.2)
Top Layer:
  circle w0.915: c16.75,16.75 r1.793
  circle w0.915: c16.75,-16.75 r1.793
  circle w0.915: c-16.75,-16.75 r1.793
  circle w0.915: c-16.75,16.75 r1.793
Bottom Layer:
  circle w0.915: c16.75,16.75 r1.793
  circle w0.915: c16.75,-16.75 r1.793
  circle w0.915: c-16.75,-16.75 r1.793
  circle w0.915: c-16.75,16.75 r1.793
Top Overlay:
  lines w0.2: -20.05,-17.75 ccw(c-17.75,-17.75) -17.75,-20.05 17.75,-20.05 ccw(c17.75,-17.75) 20.05,-17.75 20.05,17.75 ccw(c17.75,17.75) 17.75,20.05 -17.75,20.05 ccw(c-17.75,17.75) -20.05,17.75 -20.05,-17.75
  text "A1" at -22.437,17.235 h1.2
Top Solder:
  drawing of 69 lines, arcs and shapes, not listed
Mechanical 8:
  drawing of 520 lines, arcs and shapes, not listed
  text "Spring Contacts" at -5.74,7 h1
  text "COMPONENT" at -15.435,4.13 h1
  text "CLEARANCE HEIGHT 2mm" at -17.725,8.85 h1
  text "CLEARANCE HEIGHT 1mm" at -12.5,8.59 h1
  text "CLEARANCE HEIGHT 1mm" at -8.59,-12.5 h1
  text "CLEARANCE HEIGHT 2mm" at -8.85,-17.725 h1
  text "COMPONENT" at -4.13,-15.435 h1
  text "CLEARANCE HEIGHT 1mm" at 12.5,-8.59 h1
  text "CLEARANCE HEIGHT 2mm" at 17.725,-8.85 h1
  text "COMPONENT" at 15.435,-4.13 h1
  text "CLEARANCE HEIGHT 1mm" at 8.59,12.5 h1
  text "CLEARANCE HEIGHT 2mm" at 8.85,17.725 h1
  text "COMPONENT" at 4.13,15.435 h1
Mechanical 14:
  drawing of 216 lines, arcs and shapes, not listed
  text "A1" at -13.112,11.86 h1.2
  text "A1" at -9.6,8.254 h1.2
  text "A1" at -22.437,17.235 h1.2
Mechanical 15:
  lines w0.05: -20.3,-17.75 ccw(c-17.75,-17.75) -17.75,-20.3 17.75,-20.3 ccw(c17.75,-17.75) 20.3,-17.75 20.3,17.75 ccw(c17.75,17.75) 17.75,20.3 -17.75,20.3 ccw(c-17.75,17.75) -20.3,17.75 -20.3,-17.75
3D body "IDI_220393-000_Part1.stp": height 6.43, standoff -5.77, extent -19.75,-19.75 19.75,19.75
3D body "IDI_220393-000_Part2.stp": height -1.6, standoff -4.3, extent -19.25,-19.245 19.23,19.245
